# Altium schematic symbol library IC_TI.SCHLIB: 1162 symbols (part 4 of 8) (continued)
## REF3033AIDBZR
designator U?
Integrated Circuit; Manufacturer_Name: Texas Instruments; Manufacturer_Part_Number: REF3033AIDBZR; Datasheet Link: http://www.ti.com/lit/gpn/ref3033; Mouser Part Number: 595-REF3033AIDBZR; Mouser Price/Stock: https://www.mouser.com/Search/Refine.aspx?Keyword=595-REF3033AIDBZR
footprint SOT23-3 (贴片MOS的SOT-23封装)
pins: 1 IN, 2 OUT, 3 GND

## REF3040
designator U?
Integrated Circuit; Manufacturer_Name: Texas Instruments; Manufacturer_Part_Number: REF3040; Datasheet Link: http://www.tij.co.jp/jp/lit/ds/symlink/ref3040.pdf; Height: 1.12mm
footprint SOT23-3 (贴片MOS的SOT-23封装)
pins: 1 IN, 2 OUT, 3 GND

## REF3112AIDBZT
designator U?
Integrated Circuit; Manufacturer_Name: Texas Instruments; Manufacturer_Part_Number: REF3112AIDBZT; Datasheet Link: http://www.ti.com/lit/gpn/ref3112; Mouser Part Number: 595-REF3112AIDBZT; Mouser Price/Stock: https://www.mouser.com/Search/Refine.aspx?Keyword=595-REF3112AIDBZT; RS Part Number: 9222502; RS Price/Stock: http://uk.rs-online.com/web/p/products/9222502
footprint SOT23-3 (贴片MOS的SOT-23封装)
pins: 1 IN, 2 OUT, 3 GND

## REF3125AIDBZTG4
designator U?
Integrated Circuit; Manufacturer_Name: Texas Instruments; Manufacturer_Part_Number: REF3125AIDBZTG4; Datasheet Link: http://www.ti.com/lit/ds/symlink/ref3125.pdf; Height: 1.12mm; Mouser Part Number: 595-REF3125AIDBZTG4; Mouser Price/Stock: https://www.mouser.com/Search/Refine.aspx?Keyword=595-REF3125AIDBZTG4
footprint SOT23-3 (贴片MOS的SOT-23封装)
pins: 1 IN, 2 OUT, 3 GND

## REF3325AIDBZR
designator U?
Integrated Circuit; Manufacturer_Name: Texas Instruments; Manufacturer_Part_Number: REF3325AIDBZR; Datasheet Link: http://www.ti.com/lit/ds/symlink/ref3325.pdf; Height: 1.12mm; Mouser Part Number: 595-REF3325AIDBZR; Mouser Price/Stock: https://www.mouser.com/Search/Refine.aspx?Keyword=595-REF3325AIDBZR
footprint SOT23-3 (贴片MOS的SOT-23封装)
pins: 1 IN, 2 OUT, 3 GND

## REF5025ID
designator U?
Integrated Circuit; Manufacturer_Name: Texas Instruments; Manufacturer_Part_Number: REF5025ID; Datasheet Link: http://www.ti.com/general/docs/lit/getliterature.tsp?genericPartNumber=REF5025&&fileType=pdf; Height: 1.75mm; Mouser Part Number: 595-REF5025ID; Mouser Price/Stock: https://www.mouser.com/Search/Refine.aspx?Keyword=595-REF5025ID; RS Part Number: 6619704P; RS Price/Stock: http://uk.rs-online.com/web/p/products/6619704P
footprint SOIC8_1.27 (SOP, 8-Leads, Pitch 1.27mm)
pins: 1 DNC_1, 2 VIN, 3 TEMP, 4 GND, 5 TRIM/NR, 6 VOUT, 7 NC, 8 DNC_2

## REF5025IDGKT
designator U?
Integrated Circuit; Manufacturer_Name: Texas Instruments; Manufacturer_Part_Number: REF5025IDGKT; Datasheet Link: http://www.ti.com/general/docs/lit/getliterature.tsp?genericPartNumber=REF5025&&fileType=pdf; Height: 1.1mm; Mouser Part Number: 595-REF5025IDGKT; Mouser Price/Stock: https://www.mouser.com/Search/Refine.aspx?Keyword=595-REF5025IDGKT
footprint VSSOP8_0.65
pins: 1 DNC_1, 2 VIN, 3 TEMP, 4 GND, 5 TRIM/NR, 6 VOUT, 7 NC, 8 DNC_2

## REF5025SHKJ
designator U?
Integrated Circuit; Manufacturer_Name: Texas Instruments; Manufacturer_Part_Number: REF5025SHKJ; Datasheet Link: http://www.ti.com/lit/gpn/ref5025-ht; Height: 2.21mm; Mouser Part Number: 595-REF5025SHKJ; Mouser Price/Stock: https://www.mouser.com/Search/Refine.aspx?Keyword=595-REF5025SHKJ
footprint SOIC8L_1.27
pins: 1 DNC_1, 2 VIN, 3 TEMP, 4 GND, 5 TRIM/NR, 6 VOUT, 7 NC, 8 DNC_2

## REF5050AIDG4
designator U?
Integrated Circuit; Manufacturer_Name: Texas Instruments; Manufacturer_Part_Number: REF5050AIDG4; Datasheet Link: http://www.ti.com/lit/ds/symlink/ref5050.pdf; Height: 1.75mm; Mouser Part Number: 595-REF5050AIDG4; Mouser Price/Stock: https://www.mouser.com/Search/Refine.aspx?Keyword=595-REF5050AIDG4
footprint SOIC8_1.27 (SOP, 8-Leads, Pitch 1.27mm)
pins: 1 DNC_1, 2 VIN, 3 TEMP, 4 GND, 5 TRIM/NR, 6 VOUT, 7 NC, 8 DNC_2

## REF5050AIDGKR
designator U?
Integrated Circuit; Manufacturer_Name: Texas Instruments; Manufacturer_Part_Number: REF5050AIDGKR; Mouser Part Number: 595-REF5050AIDGKR; Mouser Price/Stock: https://www.mouser.com/Search/Refine.aspx?Keyword=595-REF5050AIDGKR
footprint VSSOP8_0.65
pins: 1 DNC_2, 2 VIN, 3 TEMP, 4 GND, 5 TRIM/NR, 6 VOUT, 7 NC, 8 DNC

## REG113EA
designator U?
Integrated Circuit; Manufacturer_Name: Texas Instruments; Manufacturer_Part_Number: REG113EA-3.3/250; Datasheet Link: http://www.ti.com/lit/gpn/reg113; Mouser Part Number: 595-REG113EA-3.3/250; Mouser Price/Stock: https://www.mouser.com/Search/Refine.aspx?Keyword=595-REG113EA-3.3%2F250
footprint VSSOP8_0.65-PAD
pins: 1 EN, 2 VIN, 3 VOUT, 4 NR, 5 GND_2, 6 GND_3, 7 GND_4, 8 GND

## REG113NA
designator U?
Integrated Circuit; Manufacturer_Name: Texas Instruments; Manufacturer_Part_Number: REG113NA-3.3/250; Datasheet Link: http://docs-emea.rs-online.com/webdocs/01ab/0900766b801ab96d.pdf; Height: 1.45mm; Mouser Part Number: 595-REG113NA-3.3/250; Mouser Price/Stock: https://www.mouser.com/Search/Refine.aspx?Keyword=595-REG113NA-3.3%2F250; RS Part Number: 4457179P; RS Price/Stock: http://uk.rs-online.com/web/p/products/4457179P
footprint SOT23-5 (SOT23, 5-Leads, Body 3.0x3.0mm (max), Pitch 0.95mm, IPC Medium Density)
pins: 1 VIN (in), 2 GND (power), 3 ENABLE, 4 NR, 5 VOUT (out)

## SA555D
designator U?
Integrated Circuit; Manufacturer_Name: Texas Instruments; Manufacturer_Part_Number: SA555D; Datasheet Link: http://docs-emea.rs-online.com/webdocs/0b77/0900766b80b771b7.pdf; Height: 1.75mm; Mouser Part Number: 595-SA555D; Mouser Price/Stock: https://www.mouser.com/Search/Refine.aspx?Keyword=595-SA555D; RS Part Number: 1791614; RS Price/Stock: http://uk.rs-online.com/web/p/products/1791614
footprint SOIC8_1.27 (SOP, 8-Leads, Pitch 1.27mm)
pins: 1 GND (power), 2 TRIG, 3 OUT (out), 4 RESET, 5 CONT, 6 THRES, 7 DISCH, 8 VCC (power)

## SN65HVD11HD
designator U?
Integrated Circuit; Manufacturer_Name: Texas Instruments; Manufacturer_Part_Number: SN65HVD11HD; Datasheet Link: http://www.ti.com/lit/gpn/sn65hvd11-ht; Height: 1.75mm; Mouser Part Number: 595-SN65HVD11HD; Mouser Price/Stock: https://www.mouser.com/Search/Refine.aspx?Keyword=595-SN65HVD11HD
footprint SOIC8_1.27 (SOP, 8-Leads, Pitch 1.27mm)
pins: 1 R, 2 ~{RE}, 3 DE, 4 D, 5 GND, 6 A, 7 B, 8 VCC

## SN65HVD12D
designator U?
Integrated Circuit; Manufacturer_Name: Texas Instruments; Manufacturer_Part_Number: SN65HVD12D; Datasheet Link: http://www.ti.com/lit/ds/symlink/sn65hvd12.pdf; Height: 1.75mm; Mouser Part Number: 595-SN65HVD12D; Mouser Price/Stock: https://www.mouser.com/Search/Refine.aspx?Keyword=595-SN65HVD12D; RS Part Number: 6608852; RS Price/Stock: http://uk.rs-online.com/web/p/products/6608852
footprint SOIC8_1.27 (SOP, 8-Leads, Pitch 1.27mm)
pins: 1 R, 2 ~{RE}, 3 DE, 4 D, 5 GND (power), 6 A, 7 B, 8 VCC (power)

## SN65HVD12P
designator U?
Integrated Circuit; Manufacturer_Name: Texas Instruments; Manufacturer_Part_Number: SN65HVD12P; Datasheet Link: http://www.ti.com/lit/gpn/sn65hvd12; Mouser Part Number: 595-SN65HVD12P; Mouser Price/Stock: https://www.mouser.com/Search/Refine.aspx?Keyword=595-SN65HVD12P
footprint DIP8
pins: 1 R, 2 ~RE, 3 DE, 4 D, 5 GND, 6 A, 7 B, 8 VCC

## SN65HVD72DR
designator U?
Integrated Circuit; Manufacturer_Name: Texas Instruments; Manufacturer_Part_Number: SN65HVD72DR; Datasheet Link: http://www.ti.com/lit/ds/symlink/sn65hvd72.pdf; Height: 1.75mm; Mouser Part Number: 595-SN65HVD72DR; Mouser Price/Stock: https://www.mouser.com/Search/Refine.aspx?Keyword=595-SN65HVD72DR
footprint SOIC8_1.27 (SOP, 8-Leads, Pitch 1.27mm)
pins: 1 R, 2 ~{RE}, 3 DE, 4 D, 5 GND, 6 A, 7 B, 8 VCC

## SN65HVD72DRBT
designator U?
Integrated Circuit; Manufacturer_Name: Texas Instruments; Manufacturer_Part_Number: SN65HVD72DRBT; Datasheet Link: http://www.ti.com/lit/ds/symlink/sn65hvd72.pdf; Height: 1mm; Mouser Part Number: 595-SN65HVD72DRBT; Mouser Price/Stock: https://www.mouser.com/Search/Refine.aspx?Keyword=595-SN65HVD72DRBT; RS Part Number: 1629855; RS Price/Stock: http://uk.rs-online.com/web/p/products/1629855
footprint HVSON8_0.65-PAD
pins: 1 R, 2 ~{RE}, 3 DE, 4 D, 5 GND, 6 A, 7 B, 8 VCC, 9 EP

## SN65HVD75DGKR
designator U?
Integrated Circuit; Manufacturer_Name: Texas Instruments; Manufacturer_Part_Number: SN65HVD75DGKR; Datasheet Link: http://www.ti.com/lit/ds/symlink/sn65hvd75.pdf; Height: 1.1mm; Mouser Part Number: 595-SN65HVD75DGKR; Mouser Price/Stock: https://www.mouser.com/Search/Refine.aspx?Keyword=595-SN65HVD75DGKR
footprint VSSOP8_0.65-PAD
pins: 1 R (out), 2 ~{RE} (in), 3 DE (in), 4 D (in), 5 GND (power), 6 A (io), 7 B (io), 8 VCC (power)

## SN65HVD75DR
designator U?
Integrated Circuit; Manufacturer_Name: Texas Instruments; Manufacturer_Part_Number: SN65HVD75DR; Datasheet Link: http://www.ti.com/lit/gpn/sn65hvd75; Height: 1.75mm; Mouser Part Number: 595-SN65HVD75DR; Mouser Price/Stock: https://www.mouser.com/Search/Refine.aspx?Keyword=595-SN65HVD75DR
footprint SOIC8_1.27 (SOP, 8-Leads, Pitch 1.27mm)
pins: 1 R, 2 ~{RE}, 3 DE, 4 D, 5 GND, 6 A, 7 B, 8 VCC

## SN65HVD75DRBT
designator U?
Integrated Circuit; Manufacturer_Name: Texas Instruments; Manufacturer_Part_Number: SN65HVD75DRBT; Datasheet Link: http://www.ti.com/lit/ds/symlink/sn65hvd75.pdf; Height: 1mm; Mouser Part Number: 595-SN65HVD75DRBT; Mouser Price/Stock: https://www.mouser.com/Search/Refine.aspx?Keyword=595-SN65HVD75DRBT
footprint HVSON8_0.65-PAD
pins: 1 R, 2 ~{RE}, 3 DE, 4 D, 5 GND, 6 A, 7 B, 8 VCC, 9 EPAD

## SN65HVD78DGKR
designator U?
Integrated Circuit; Manufacturer_Name: Texas Instruments; Manufacturer_Part_Number: SN65HVD78DGKR; Datasheet Link: http://www.ti.com/lit/gpn/sn65hvd78; Height: 1.1mm; Mouser Part Number: 595-SN65HVD78DGKR; Mouser Price/Stock: https://www.mouser.com/Search/Refine.aspx?Keyword=595-SN65HVD78DGKR
footprint VSSOP8_0.65-PAD
pins: 1 R, 2 ~{RE}, 3 DE, 4 D, 5 GND, 6 A, 7 B, 8 VCC

## SN65HVD78DR
designator U?
Integrated Circuit; Manufacturer_Name: Texas Instruments; Manufacturer_Part_Number: SN65HVD78DR; Datasheet Link: http://www.ti.com/lit/gpn/sn65hvd78; Height: 1.75mm; Mouser Part Number: 595-SN65HVD78DR; Mouser Price/Stock: https://www.mouser.com/Search/Refine.aspx?Keyword=595-SN65HVD78DR
footprint SOIC8_1.27 (SOP, 8-Leads, Pitch 1.27mm)
pins: 1 R, 2 ~{RE}, 3 DE, 4 D, 5 GND, 6 A, 7 B, 8 VCC

## SN65HVD82DR
designator U?
Integrated Circuit; Manufacturer_Name: Texas Instruments; Manufacturer_Part_Number: SN65HVD82DR; Datasheet Link: https://componentsearchengine.com/Datasheets/1/SN65HVD82DR.pdf; Height: 1.75mm; Mouser Part Number: 595-SN65HVD82DR; Mouser Price/Stock: https://www.mouser.com/Search/Refine.aspx?Keyword=595-SN65HVD82DR
footprint SOIC8_1.27 (SOP, 8-Leads, Pitch 1.27mm)
pins: 1 R (out), 2 RE/ (in), 3 DE (in), 4 D (in), 5 GND (power), 6 A (io), 7 B (io), 8 VCC (power)

## SN65HVD230D
designator U?
Integrated Circuit; Manufacturer_Name: Texas Instruments; Manufacturer_Part_Number: SN65HVD230D; Datasheet Link: http://www.ti.com/lit/ds/symlink/sn65hvd230.pdf; Height: 1.75mm; Mouser Part Number: 595-SN65HVD230D; Mouser Price/Stock: https://www.mouser.com/Search/Refine.aspx?Keyword=595-SN65HVD230D; RS Part Number: 4619759P; RS Price/Stock: http://uk.rs-online.com/web/p/products/4619759P
footprint SOIC8_1.27 (SOP, 8-Leads, Pitch 1.27mm)
pins: 1 D, 2 GND (power), 3 VCC (power), 4 R, 5 VREF (in), 6 CANL, 7 CANH, 8 RS

## SN65HVD231QDRQ1
designator U?
Integrated Circuit; Manufacturer_Name: Texas Instruments; Manufacturer_Part_Number: SN65HVD231QDRQ1; Datasheet Link: http://www.ti.com/lit/ds/symlink/sn65hvd231q-q1.pdf; Height: 1.75mm; Mouser Part Number: 595-SN65HVD231QDRQ1; Mouser Price/Stock: https://www.mouser.com/Search/Refine.aspx?Keyword=595-SN65HVD231QDRQ1
footprint SOIC8_1.27 (SOP, 8-Leads, Pitch 1.27mm)
pins: 1 D, 2 GND, 3 VCC, 4 R, 5 VREF, 6 CANL, 7 CANH, 8 RS

## SN65HVD232QD
designator U?
Integrated Circuit; Manufacturer_Name: Texas Instruments; Manufacturer_Part_Number: SN65HVD232QD; Datasheet Link: http://www.ti.com/lit/ds/symlink/sn65hvd232q.pdf; Height: 1.75mm; Mouser Part Number: 595-SN65HVD232QD; Mouser Price/Stock: https://www.mouser.com/Search/Refine.aspx?Keyword=595-SN65HVD232QD; RS Part Number: 9233798; RS Price/Stock: http://uk.rs-online.com/web/p/products/9233798
footprint SOIC8_1.27 (SOP, 8-Leads, Pitch 1.27mm)
pins: 1 D, 2 GND, 3 VCC, 4 R, 5 NC_1, 6 CANL, 7 CANH, 8 NC_2

## SN65HVD233HD
designator U?
Integrated Circuit; Manufacturer_Name: Texas Instruments; Manufacturer_Part_Number: SN65HVD233HD; Datasheet Link: http://www.ti.com/lit/gpn/sn65hvd233-ht; Height: 1.75mm; Mouser Part Number: 595-SN65HVD233HD; Mouser Price/Stock: https://www.mouser.com/Search/Refine.aspx?Keyword=595-SN65HVD233HD
footprint SOIC8_1.27 (SOP, 8-Leads, Pitch 1.27mm)
pins: 1 D, 2 GND, 3 VCC, 4 R, 5 LBK, 6 CANL, 7 CANH, 8 RS

## SN65HVD234DR
designator U?
Integrated Circuit; Manufacturer_Name: Texas Instruments; Manufacturer_Part_Number: SN65HVD234DR; Datasheet Link: http://www.ti.com/lit/gpn/sn65hvd234; Height: 1.75mm; Mouser Part Number: 595-SN65HVD234DR; Mouser Price/Stock: https://www.mouser.com/Search/Refine.aspx?Keyword=595-SN65HVD234DR
footprint SOIC8_1.27 (SOP, 8-Leads, Pitch 1.27mm)
pins: 1 D, 2 GND, 3 VCC, 4 R, 5 EN, 6 CANL, 7 CANH, 8 RS

## SN65HVD235D
designator U?
Integrated Circuit; Manufacturer_Name: Texas Instruments; Manufacturer_Part_Number: SN65HVD235D; Datasheet Link: http://www.ti.com/lit/gpn/sn65hvd235; Mouser Part Number: 595-SN65HVD235D; Mouser Price/Stock: https://www.mouser.com/Search/Refine.aspx?Keyword=595-SN65HVD235D; RS Part Number: 6624318P; RS Price/Stock: http://uk.rs-online.com/web/p/products/6624318P
footprint SOIC8_1.27 (SOP, 8-Leads, Pitch 1.27mm)
pins: 1 D, 2 GND, 3 VCC, 4 R, 5 AB, 6 CANL, 7 CANH, 8 RS

## SN65HVD251D
designator U?
Integrated Circuit; Manufacturer_Name: Texas Instruments; Manufacturer_Part_Number: SN65HVD251D; Datasheet Link: http://www.ti.com/lit/ds/symlink/sn65hvd251.pdf; Height: 1.75mm; Mouser Part Number: 595-SN65HVD251D; Mouser Price/Stock: https://www.mouser.com/Search/Refine.aspx?Keyword=595-SN65HVD251D; RS Part Number: 4619787; RS Price/Stock: http://uk.rs-online.com/web/p/products/4619787
footprint SOIC8_1.27 (SOP, 8-Leads, Pitch 1.27mm)
pins: 1 D, 2 GND (power), 3 VCC (power), 4 R, 5 VREF (in), 6 CANL, 7 CANH, 8 RS

## SN65HVD251P
designator U?
Integrated Circuit; Manufacturer_Name: Texas Instruments; Manufacturer_Part_Number: SN65HVD251P; Datasheet Link: http://docs-emea.rs-online.com/webdocs/0cb1/0900766b80cb1489.pdf; Height: 5.08mm; Mouser Part Number: 595-SN65HVD251P; Mouser Price/Stock: https://www.mouser.com/Search/Refine.aspx?Keyword=595-SN65HVD251P; RS Part Number: 9222729; RS Price/Stock: http://uk.rs-online.com/web/p/products/9222729
footprint DIP8-A
pins: 1 D (in), 2 GND (power), 3 VCC (power), 4 R (out), 5 VREF (power), 6 CANL (out), 7 CANH (out), 8 RS (in)

## SN65HVD485EDR
designator U?
Integrated Circuit; Manufacturer_Name: Texas Instruments; Manufacturer_Part_Number: SN65HVD485EDR; Datasheet Link: http://www.ti.com/lit/gpn/sn65hvd485e; Mouser Part Number: 595-SN65HVD485EDR; Mouser Price/Stock: https://www.mouser.com/Search/Refine.aspx?Keyword=595-SN65HVD485EDR; RS Part Number: 1684340; RS Price/Stock: http://uk.rs-online.com/web/p/products/1684340
footprint SOIC8_1.27 (SOP, 8-Leads, Pitch 1.27mm)
pins: 1 R, 2 ~RE, 3 DE, 4 D, 5 GND, 6 A, 7 B, 8 VCC

## SN65HVD1050D
designator U?
Integrated Circuit; Manufacturer_Name: Texas Instruments; Manufacturer_Part_Number: SN65HVD1050D; Datasheet Link: http://docs-emea.rs-online.com/webdocs/0b77/0900766b80b773db.pdf; Height: 1.75mm; Mouser Part Number: 595-SN65HVD1050D; Mouser Price/Stock: https://www.mouser.com/Search/Refine.aspx?Keyword=595-SN65HVD1050D; RS Part Number: 0527855; RS Price/Stock: http://uk.rs-online.com/web/p/products/0527855
footprint SOIC8_1.27 (SOP, 8-Leads, Pitch 1.27mm)
pins: 1 TXD, 2 GND (power), 3 VCC (power), 4 RXD, 5 VREF (in), 6 CANL, 7 CANH, 8 S

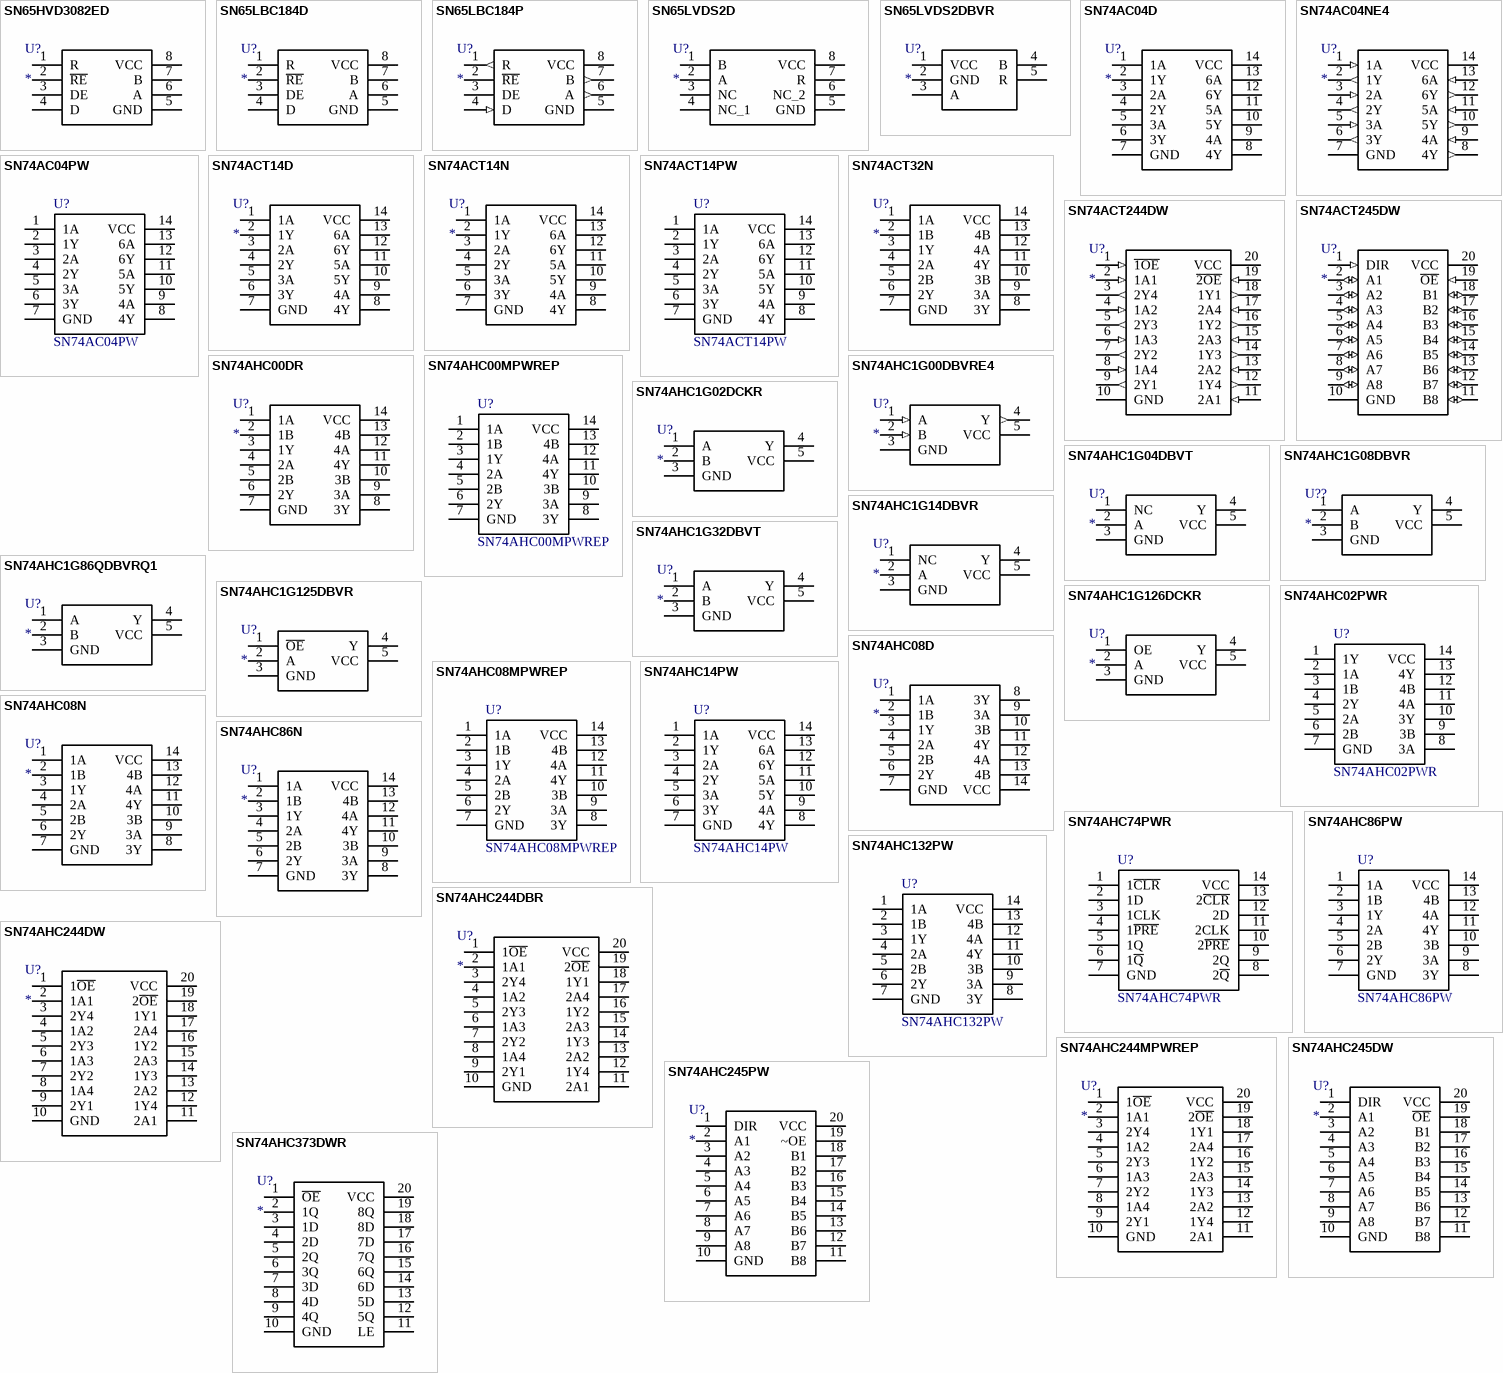
[diagram p18: symbols SN65HVD3082ED to SN74AHC373DWR]

## SN65HVD3082ED
designator U?
Integrated Circuit; Manufacturer_Name: Texas Instruments; Manufacturer_Part_Number: SN65HVD3082ED; Datasheet Link: http://www.ti.com/lit/ds/symlink/sn65hvd3082e.pdf; Height: 1.75mm; Mouser Part Number: 595-SN65HVD3082ED; Mouser Price/Stock: https://www.mouser.com/Search/Refine.aspx?Keyword=595-SN65HVD3082ED; RS Part Number: 0527845; RS Price/Stock: http://uk.rs-online.com/web/p/products/0527845
footprint SOIC8_1.27 (SOP, 8-Leads, Pitch 1.27mm)
pins: 1 R, 2 ~{RE}, 3 DE, 4 D, 5 GND (power), 6 A, 7 B, 8 VCC (power)

## SN65LBC184D
designator U?
Integrated Circuit; Manufacturer_Name: Texas Instruments; Manufacturer_Part_Number: SN65LBC184D; Datasheet Link: http://docs-emea.rs-online.com/webdocs/0288/0900766b80288f96.pdf; Height: 1.75mm; Mouser Part Number: 595-SN65LBC184D; Mouser Price/Stock: https://www.mouser.com/Search/Refine.aspx?Keyword=595-SN65LBC184D; RS Part Number: 1003883; RS Price/Stock: http://uk.rs-online.com/web/p/products/1003883
footprint SOIC8_1.27 (SOP, 8-Leads, Pitch 1.27mm)
pins: 1 R, 2 ~{RE}, 3 DE, 4 D, 5 GND (power), 6 A, 7 B, 8 VCC (power)

## SN65LBC184P
designator U?
Integrated Circuit; Manufacturer_Name: Texas Instruments; Manufacturer_Part_Number: SN65LBC184P; Datasheet Link: http://www.ti.com/lit/ds/symlink/sn65lbc184.pdf; Height: 5.08mm; Mouser Part Number: 595-SN65LBC184P; Mouser Price/Stock: https://www.mouser.com/Search/Refine.aspx?Keyword=595-SN65LBC184P; RS Part Number: 6604459; RS Price/Stock: http://uk.rs-online.com/web/p/products/6604459
footprint DIP8-A
pins: 1 R (out), 2 ~{RE}, 3 DE, 4 D (in), 5 GND (power), 6 A (out), 7 B (out), 8 VCC (power)

## SN65LVDS2D
designator U?
Integrated Circuit; Manufacturer_Name: Texas Instruments; Manufacturer_Part_Number: SN65LVDS2D; Datasheet Link: http://www.ti.com/lit/ds/symlink/sn65lvds1.pdf; Height: 1.75mm; Mouser Part Number: 595-SN65LVDS2D; Mouser Price/Stock: https://www.mouser.com/Search/Refine.aspx?Keyword=595-SN65LVDS2D; RS Part Number: 1456515; RS Price/Stock: http://uk.rs-online.com/web/p/products/1456515
footprint SOIC8_1.27 (SOP, 8-Leads, Pitch 1.27mm)
pins: 1 B, 2 A, 3 NC, 4 NC_1, 5 GND (power), 6 NC_2, 7 R, 8 VCC (power)

## SN65LVDS2DBVR
designator U?
Integrated Circuit; Manufacturer_Name: Texas Instruments; Manufacturer_Part_Number: SN65LVDS2DBVR; Datasheet Link: http://www.ti.com/lit/ds/symlink/sn65lvds1.pdf; Height: 1.45mm; Mouser Part Number: 595-SN65LVDS2DBVR; Mouser Price/Stock: https://www.mouser.com/Search/Refine.aspx?Keyword=595-SN65LVDS2DBVR; RS Part Number: 6606752P; RS Price/Stock: http://uk.rs-online.com/web/p/products/6606752P
footprint SOT23-5 (SOT23, 5-Leads, Body 3.0x3.0mm (max), Pitch 0.95mm, IPC Medium Density)
pins: 1 VCC (power), 2 GND (power), 3 A, 4 B, 5 R

## SN74AC04D
designator U?
Integrated Circuit; Manufacturer_Name: Texas Instruments; Manufacturer_Part_Number: SN74AC04D; Datasheet Link: http://www.ti.com/lit/ds/symlink/sn74ac04.pdf; Height: 1.75mm; Mouser Part Number: 595-SN74AC04D; Mouser Price/Stock: https://www.mouser.com/Search/Refine.aspx?Keyword=595-SN74AC04D; RS Part Number: 6630944P; RS Price/Stock: http://uk.rs-online.com/web/p/products/6630944P
footprint SOIC14_1.27
pins: 1 1A, 2 1Y, 3 2A, 4 2Y, 5 3A, 6 3Y, 7 GND (power), 8 4Y, 9 4A, 10 5Y, 11 5A, 12 6Y, 13 6A, 14 VCC (power)

## SN74AC04NE4
designator U?
Integrated Circuit; Manufacturer_Name: Texas Instruments; Manufacturer_Part_Number: SN74AC04NE4; Datasheet Link: http://www.ti.com/lit/ds/symlink/sn74ac04.pdf; Height: 5.08mm; Mouser Part Number: 595-SN74AC04NE4; Mouser Price/Stock: https://www.mouser.com/Search/Refine.aspx?Keyword=595-SN74AC04NE4; RS Part Number: 1450194; RS Price/Stock: http://uk.rs-online.com/web/p/products/1450194
footprint DIP14-A
pins: 1 1A (in), 2 1Y (out), 3 2A (in), 4 2Y (out), 5 3A (in), 6 3Y (out), 7 GND (power), 8 4Y (out), 9 4A (in), 10 5Y (out), 11 5A (in), 12 6Y (out), 13 6A (in), 14 VCC (power)

## SN74AC04PW
designator U?
Integrated Circuit; Manufacturer_Name: Texas Instruments; Manufacturer_Part_Number: SN74AC04PW; Mouser Part Number: 595-SN74AC04PW
footprint TSSOP14_0.65 (TSOP, 14-Leads, Body 5.00x4.40mm, Pitch 0.65mm, Thermal Pad 2.31x2.46mm, IPC Low Density)
pins: 1 1A, 2 1Y, 3 2A, 4 2Y, 5 3A, 6 3Y, 7 GND, 8 4Y, 9 4A, 10 5Y, 11 5A, 12 6Y, 13 6A, 14 VCC

## SN74ACT14D
designator U?
Integrated Circuit; Manufacturer_Name: Texas Instruments; Manufacturer_Part_Number: SN74ACT14D; Datasheet Link: http://www.ti.com/lit/ds/symlink/sn74act14.pdf; Height: 1.75mm; Mouser Part Number: 595-SN74ACT14D; Mouser Price/Stock: https://www.mouser.com/Search/Refine.aspx?Keyword=595-SN74ACT14D; RS Part Number: 6631048; RS Price/Stock: http://uk.rs-online.com/web/p/schmitt-trigger-inverters/6631048/?source=DS
footprint SOIC14_1.27
pins: 1 1A, 2 1Y, 3 2A, 4 2Y, 5 3A, 6 3Y, 7 GND (power), 8 4Y, 9 4A, 10 5Y, 11 5A, 12 6Y, 13 6A, 14 VCC (power)

## SN74ACT14N
designator U?
Integrated Circuit; Manufacturer_Name: Texas Instruments; Manufacturer_Part_Number: SN74ACT14N; Datasheet Link: http://www.ti.com/lit/gpn/sn74act14; Mouser Part Number: 595-SN74ACT14N; Mouser Price/Stock: https://www.mouser.com/Search/Refine.aspx?Keyword=595-SN74ACT14N; RS Part Number: 8072551; RS Price/Stock: http://uk.rs-online.com/web/p/products/8072551
footprint DIP14
pins: 1 1A, 2 1Y, 3 2A, 4 2Y, 5 3A, 6 3Y, 7 GND, 8 4Y, 9 4A, 10 5Y, 11 5A, 12 6Y, 13 6A, 14 VCC

## SN74ACT14PW
designator U?
Integrated Circuit; Manufacturer_Name: Texas Instruments; Manufacturer_Part_Number: SN74ACT14PW; Mouser Part Number: 595-SN74ACT14PW; Mouser Price/Stock: https://www.mouser.com/Search/Refine.aspx?Keyword=595-SN74ACT14PW; RS Part Number: 6631041P; RS Price/Stock: http://uk.rs-online.com/web/p/products/6631041P
footprint TSSOP14_0.65 (TSOP, 14-Leads, Body 5.00x4.40mm, Pitch 0.65mm, Thermal Pad 2.31x2.46mm, IPC Low Density)
pins: 1 1A, 2 1Y, 3 2A, 4 2Y, 5 3A, 6 3Y, 7 GND, 8 4Y, 9 4A, 10 5Y, 11 5A, 12 6Y, 13 6A, 14 VCC

## SN74ACT32N
designator U?
Integrated Circuit; Manufacturer_Name: Texas Instruments; Manufacturer_Part_Number: SN74ACT32N; Datasheet Link: http://www.ti.com/lit/gpn/sn74act32; Mouser Part Number: 595-SN74ACT32N; Mouser Price/Stock: https://www.mouser.com/Search/Refine.aspx?Keyword=595-SN74ACT32N; RS Part Number: 6631067; RS Price/Stock: http://uk.rs-online.com/web/p/standard-logic-gates/6631067/?source=DS
footprint DIP14
pins: 1 1A, 2 1B, 3 1Y, 4 2A, 5 2B, 6 2Y, 7 GND, 8 3Y, 9 3A, 10 3B, 11 4Y, 12 4A, 13 4B, 14 VCC

## SN74ACT244DW
designator U?
Integrated Circuit; Manufacturer_Name: Texas Instruments; Manufacturer_Part_Number: SN74ACT244DW; Datasheet Link: http://www.ti.com/lit/ds/symlink/sn74act244.pdf; Height: 2.65mm; Mouser Part Number: 595-SN74ACT244DW; Mouser Price/Stock: https://www.mouser.com/Search/Refine.aspx?Keyword=595-SN74ACT244DW; RS Part Number: 4363169; RS Price/Stock: http://uk.rs-online.com/web/p/products/4363169
footprint SOIC20W_1.27
pins: 1 ~{1OE} (in), 2 1A1 (in), 3 2Y4 (out), 4 1A2 (in), 5 2Y3 (out), 6 1A3 (in), 7 2Y2 (out), 8 1A4 (in), 9 2Y1 (out), 10 GND (power), 11 2A1 (in), 12 1Y4 (out), 13 2A2 (in), 14 1Y3 (out), 15 2A3 (in), 16 1Y2 (out), 17 2A4 (in), 18 1Y1 (out), 19 ~{2OE} (in), 20 VCC (power)

## SN74ACT245DW
designator U?
Integrated Circuit; Manufacturer_Name: Texas Instruments; Manufacturer_Part_Number: SN74ACT245DW; Datasheet Link: http://www.ti.com/lit/ds/symlink/sn74act245.pdf; Height: 2.65mm; Mouser Part Number: 595-SN74ACT245DW; Mouser Price/Stock: https://www.mouser.com/Search/Refine.aspx?Keyword=595-SN74ACT245DW; RS Part Number: 4363175; RS Price/Stock: http://uk.rs-online.com/web/p/products/4363175
footprint SOIC20W_1.27
pins: 1 DIR (in), 2 A1 (io), 3 A2 (io), 4 A3 (io), 5 A4 (io), 6 A5 (io), 7 A6 (io), 8 A7 (io), 9 A8 (io), 10 GND (power), 11 B8 (io), 12 B7 (io), 13 B6 (io), 14 B5 (io), 15 B4 (io), 16 B3 (io), 17 B2 (io), 18 B1 (io), 19 ~{OE} (in), 20 VCC (power)

## SN74AHC00DR
designator U?
Integrated Circuit; Manufacturer_Name: Texas Instruments; Manufacturer_Part_Number: SN74AHC00DR; Datasheet Link: http://www.ti.com/lit/gpn/sn74ahc00; Height: 1.75mm; Mouser Part Number: 595-SN74AHC00DR; Mouser Price/Stock: https://www.mouser.com/Search/Refine.aspx?Keyword=595-SN74AHC00DR
footprint SOIC14_1.27
pins: 1 1A, 2 1B, 3 1Y, 4 2A, 5 2B, 6 2Y, 7 GND, 8 3Y, 9 3A, 10 3B, 11 4Y, 12 4A, 13 4B, 14 VCC

## SN74AHC00MPWREP
designator U?
Integrated Circuit; Manufacturer_Name: Texas Instruments; Datasheet Link: http://www.ti.com/lit/gpn/sn74ahc00-ep; Height: 1.2mm; Manufacturer_Part_Number: SN74AHC00MPWREP; Mouser Part Number: 595-SN74AHC00MPWREP; Mouser Price/Stock: https://www.mouser.com/Search/Refine.aspx?Keyword=595-SN74AHC00MPWREP
footprint TSSOP14_0.65 (TSOP, 14-Leads, Body 5.00x4.40mm, Pitch 0.65mm, Thermal Pad 2.31x2.46mm, IPC Low Density)
pins: 1 1A, 2 1B, 3 1Y, 4 2A, 5 2B, 6 2Y, 7 GND, 8 3Y, 9 3A, 10 3B, 11 4Y, 12 4A, 13 4B, 14 VCC

## SN74AHC1G00DBVRE4
designator U?
Integrated Circuit; Manufacturer_Name: Texas Instruments; Manufacturer_Part_Number: SN74AHC1G00DBVRE4; Datasheet Link: http://www.ti.com/lit/ds/symlink/sn74ahc1g00.pdf; Height: 1.45mm; Mouser Part Number: 595-SN74AHC1G00DBE4; Mouser Price/Stock: https://www.mouser.com/Search/Refine.aspx?Keyword=595-SN74AHC1G00DBE4
footprint SOT23-5 (SOT23, 5-Leads, Body 3.0x3.0mm (max), Pitch 0.95mm, IPC Medium Density)
pins: 1 A (in), 2 B (in), 3 GND (power), 4 Y (out), 5 VCC (power)

## SN74AHC1G02DCKR
designator U?
Integrated Circuit; Manufacturer_Name: Texas Instruments; Manufacturer_Part_Number: SN74AHC1G02DCKR; Datasheet Link: http://www.ti.com/lit/ds/symlink/sn74ahc1g02.pdf; Height: 1.1mm; Mouser Part Number: 595-SN74AHC1G02DCKR; Mouser Price/Stock: https://www.mouser.com/Search/Refine.aspx?Keyword=595-SN74AHC1G02DCKR; RS Part Number: 4514042; RS Price/Stock: http://uk.rs-online.com/web/p/products/4514042
footprint SOT353
pins: 1 A, 2 B, 3 GND (power), 4 Y, 5 VCC (power)

## SN74AHC1G04DBVT
designator U?
Integrated Circuit; Manufacturer_Name: Texas Instruments; Manufacturer_Part_Number: SN74AHC1G04DBVT; Datasheet Link: http://www.ti.com/lit/ds/symlink/sn74ahc1g04.pdf; Height: 1.45mm; Mouser Part Number: 595-SN74AHC1G04DBVT; Mouser Price/Stock: https://www.mouser.com/Search/Refine.aspx?Keyword=595-SN74AHC1G04DBVT; RS Part Number: 1695663; RS Price/Stock: http://uk.rs-online.com/web/p/products/1695663
footprint SOT23-5 (SOT23, 5-Leads, Body 3.0x3.0mm (max), Pitch 0.95mm, IPC Medium Density)
pins: 1 NC, 2 A, 3 GND, 4 Y, 5 VCC

## SN74AHC1G08DBVR
designator U??
Undefined or Miscellaneous; Manufacturer_Name: Texas Instruments; Manufacturer_Part_Number: SN74AHC1G08DBVR; Datasheet Link: http://www.ti.com/general/docs/lit/getliterature.tsp?genericPartNumber=SN74AHC1G08&&fileType=pdf; Height: 1.45mm; Mouser Part Number: 595-SN74AHC1G08DBVR; Mouser Price/Stock: https://www.mouser.com/Search/Refine.aspx?Keyword=595-SN74AHC1G08DBVR; RS Part Number: 1218343; RS Price/Stock: http://uk.rs-online.com/web/p/products/1218343
footprint SOT23-5 (SOT23, 5-Leads, Body 3.0x3.0mm (max), Pitch 0.95mm, IPC Medium Density)
pins: 1 A, 2 B, 3 GND, 4 Y, 5 VCC

## SN74AHC1G14DBVR
designator U?
Integrated Circuit; Manufacturer_Name: Texas Instruments; Manufacturer_Part_Number: SN74AHC1G14DBVR; Datasheet Link: http://www.ti.com/lit/ds/symlink/sn74ahc1g14.pdf; Height: 1.45mm; Mouser Part Number: 595-SN74AHC1G14DBVR; Mouser Price/Stock: https://www.mouser.com/Search/Refine.aspx?Keyword=595-SN74AHC1G14DBVR; RS Part Number: 1218340; RS Price/Stock: http://uk.rs-online.com/web/p/products/1218340
footprint SOT23-5 (SOT23, 5-Leads, Body 3.0x3.0mm (max), Pitch 0.95mm, IPC Medium Density)
pins: 1 NC, 2 A, 3 GND (power), 4 Y, 5 VCC (power)

## SN74AHC1G32DBVT
designator U?
Integrated Circuit; Manufacturer_Name: Texas Instruments; Manufacturer_Part_Number: SN74AHC1G32DBVT; Datasheet Link: http://www.ti.com/general/docs/lit/getliterature.tsp?genericPartNumber=sn74ahc1g32&fileType=pdf; Height: 1.45mm; Mouser Part Number: 595-SN74AHC1G32DBVT; Mouser Price/Stock: https://www.mouser.com/Search/Refine.aspx?Keyword=595-SN74AHC1G32DBVT; RS Part Number: 6627730P; RS Price/Stock: http://uk.rs-online.com/web/p/products/6627730P
footprint SOT23-5 (SOT23, 5-Leads, Body 3.0x3.0mm (max), Pitch 0.95mm, IPC Medium Density)
pins: 1 A, 2 B, 3 GND, 4 Y, 5 VCC